# Altium footprint library SWLIB(150721).PcbLib: 348 footprints (part 15 of 22)
Each footprint in its own frame and in the unit in brackets; x right, y up, seen from the top. Pads: shape width x height; smd on the part's side, far side on the other; paste and mask are expansions set on the pad; w line width, h text height; cw(c..) or ccw(c..) is an arc to the next point about the centre after c.
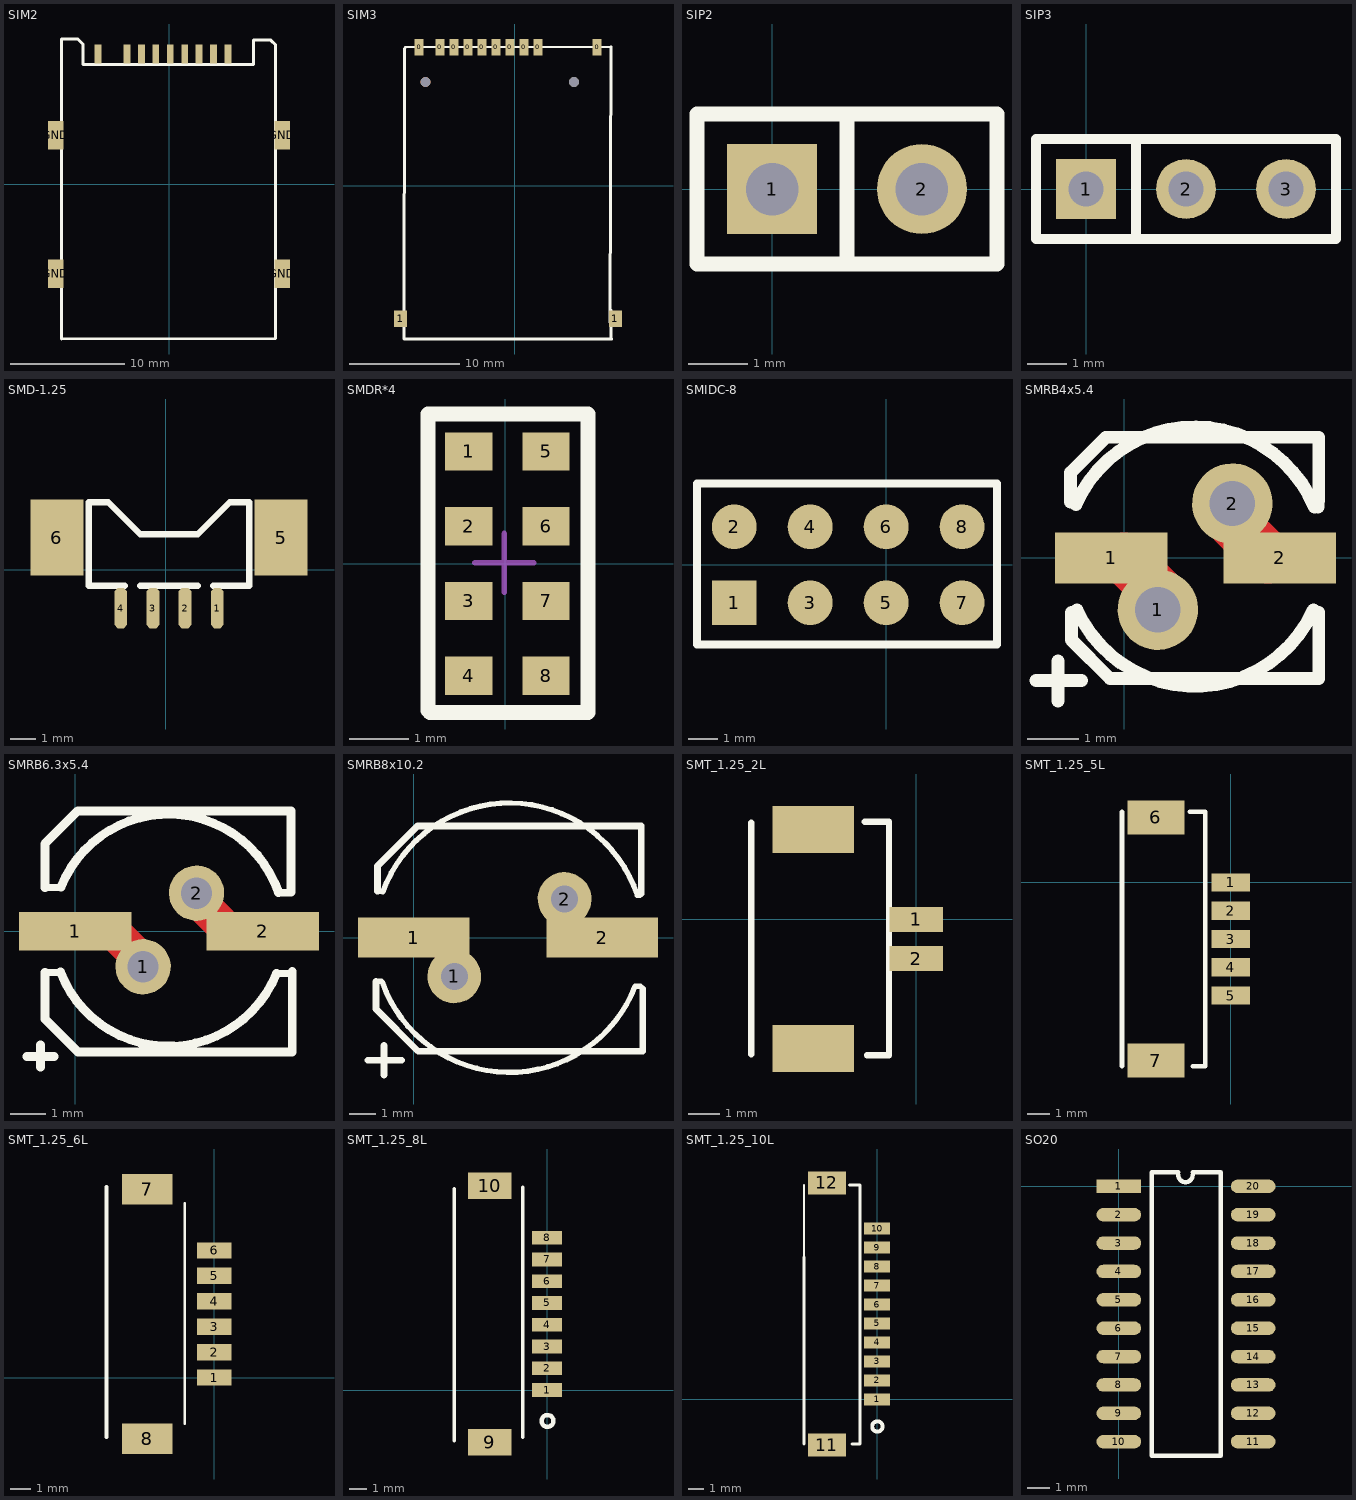
[diagram p14: the footprints below, top view; thin cyan lines are the x and y axes]

## SIM2 [mm]
pads (13):
  rect 0.6x1.65 smd: 0(-6.25,11.44) 0(-3.7,11.44) 0(-2.43,11.44) 0(-1.16,11.44) 0(0.11,11.44) 0(1.38,11.44) 0(2.65,11.44) 0(3.92,11.44) 0(5.19,11.44)
  rect 1.35x2.5 smd: GND(-9.95,-7.884) GND(-9.95,4.316) GND(9.95,-7.884) GND(9.95,4.315)
Top Overlay:
  lines w0.254: -9.44,-13.604 9.356,-13.553 9.356,12.253 8.949,12.66 7.425,12.66 7.425,10.526 -7.561,10.526 -7.561,12.304 -8.018,12.761 -9.186,12.761 -9.44,12.761 -9.44,-13.604

## SIM3 [mm]
pads (12):
  rect 0.8x1.5 smd: 0(-8.705,12.579) 0(-6.805,12.579) 0(-5.535,12.579) 0(-4.265,12.579) 0(-2.995,12.579) 0(-1.725,12.579) 0(-0.455,12.579) 0(0.815,12.579) 0(2.085,12.579) 0(7.445,12.579)
  rect 1.2x1.5 smd: 1(-10.385,-12.071) 1(9.115,-12.071)
via -8.135,9.429 diameter 0.9 hole 0.9
via 5.365,9.429 diameter 0.9 hole 0.9
Top Overlay:
  lines w0.254: 7.143,12.579 8.718,12.629 ; 8.616,-12.364 8.718,12.629 ; 8.718,-11.247 8.718,-13.837 8.769,-13.888 8.007,-13.888 -10.078,-13.888 -10.027,12.477 -9.926,12.579 8.718,12.629

## SIP2 [mil]
pads (2):
  rect 60x60 hole 35: 1(0,0)
  round 60 hole 35: 2(100,0)
Top Overlay:
  lines w10: 50,-50 50,50 ; -50,-50 -50,50 150,50 150,-50 -50,-50

## SIP3 [mil]
pads (3):
  rect 60x60 hole 35: 1(0,0)
  round 60 hole 35: 2(100,0) 3(200,0)
Top Overlay:
  lines w10: 50,-50 50,50 ; -50,-50 250,-50 250,50 -50,50 -50,-50

## SMD-1.25 [mm]
height 5.7
pads (6):
  oct 0.5x1.6 smd: 1(2.032,-1.524) 2(0.762,-1.524) 3(-0.508,-1.524) 4(-1.778,-1.524)
  rect 2.1x3 smd: 5(4.572,1.27) 6(-4.318,1.27)
Top Overlay:
  lines w0.254: -1.626,-0.635 -3.048,-0.635 -3.048,2.667 -2.993,2.667 -2.521,2.667 -2.286,2.667 -1.016,1.397 1.27,1.397 2.54,2.667 3.302,2.667 3.302,-0.635 1.879,-0.635 ; -1.016,-0.635 1.27,-0.635
3D body "SW3dPS-molex 53398-0390.STEP": height 4.76, standoff -0.04, extent -4.958,-1.588 5.192,2.612

## SMDR*4 [mm] "SOIC, 8-Leads, Body 3.2x3.2mm (max), Pitch 1.27mm, IPC Medium Density"
height 1
pads (8):
  rect 0.8x0.65 smd: 1(-0.616,1.905) 2(-0.616,0.635) 3(-0.616,-0.635) 4(-0.616,-1.905) 5(0.699,1.905) 6(0.699,0.635) 7(0.699,-0.635) 8(0.699,-1.905)
Top Overlay:
  lines w0.254: -1.306,2.53 -1.306,-2.497 -1.273,-2.53 1.407,-2.53 1.407,2.54 -1.306,2.54
Mechanical 15:
  lines w0.1: -0.513,0.013 0.487,0.013 ; -0.013,-0.487 -0.013,0.513 ; -1.262,-2.555 -1.262,2.53 1.351,2.53 1.351,-2.555 -1.262,-2.555

## SMIDC-8 [mm]
pads (8):
  rect 1.499x1.499 smd: 1(-5.08,-1.27)
  round 1.5 smd: 2(-5.08,1.27) 3(-2.54,-1.27) 4(-2.54,1.27) 5(0,-1.27) 6(0,1.27) 7(2.54,-1.27) 8(2.54,1.27)
Top Overlay:
  lines w0.254: -6.325,-2.667 -6.325,2.718 3.708,2.718 3.708,-2.667 -6.325,-2.667

## SMRB4x5.4 [mil]
pads (4):
  rect 86.61x39.37 smd: 1(-10,0) 2(120,0)
  round 62 hole 35: 1(26,-40) 2(83.36,41.92)
Top Layer:
  lines w39.37: 0,0 26,-26 26,-40 ; 83.36,41.92 83.36,27.64 111,0
Top Overlay:
  lines w10: -68,-94.5 -33,-94.5 ; -51,-110.5 -51,-79.5 ; -41.36,43 -41.36,65.64 -14,93 150,93 150,44.32 149.61,43.93 149.61,39.3 ; -40.61,-42 -40.61,-63.39 -40,-64 -11,-93 150,-93 150,-42 ; -37.26,41.2 cw(c54.32,1.04) 146.72,39.3 ; -36.49,-40.14 ccw(c54.68,0.96) 145.85,-40.13
3D body "SL-B.STEP": height 204.72, standoff 0, extent -36.55,-83.72 144.55,85.57

## SMRB6.3x5.4 [mil]
pads (4):
  rect 125.98x43.31 smd: 1(0,0) 2(210,0)
  round 62 hole 35: 1(76.02,-39.7) 2(135.83,42.72)
Top Layer:
  lines w39.37: 45,-3 76.02,-34.02 76.02,-39.7 ; 135.83,42.72 135.83,36.17 162,10
Top Overlay:
  lines w7.87: -34,-46 -17.15,-46 -16.62,-45.47 ; -34,49 -16.58,49 -15.98,49.59 ; 225.35,-47.14 240.86,-47.14 243,-45 ; 227.73,43.23 240.82,43.23 241.59,44
  lines w10: -54,-140 -24,-140 ; -39,-152 -39,-127 ; -34,-46 -34,-98 3,-135 243,-135 243,-45 ; -34,49 -34,98 2.84,134.84 241.59,134.84 241.59,44 ; -16.62,-45.47 ccw(c104.7,1.25) 225.35,-47.14 ; -15.98,49.59 cw(c104.7,1.25) 227.73,43.23
3D body "SL-E.STEP": height 204.72, standoff 0, extent -34.23,-131.32 241.36,128.52

## SMRB8x10.2 [mil]
pads (4):
  rect 165.35x59.06 smd: 1(0,0) 2(280,0)
  round 80 hole 40: 1(60.27,-57.49) 2(224.1,57.22)
Top Layer:
  lines w39.37: 29,0 60.27,-31.27 60.27,-57.49 ; 224.1,57.22 224.1,7.9 235,-3
Top Overlay:
  lines w5: -56,-65 -54.8,-66.2 -46.58,-66.2 ; -53.78,69 -47.02,69 -45.89,67.87 ; 328.7,-72.34 336.34,-72.34 340,-76 ; 331.94,63.08 335.78,63.08
  lines w7.87: -56,-65 -48,-65 ; -53.78,69 -47.02,69 -45.89,67.87 ; 328.7,-72.34 336.34,-72.34 340,-76 ; 331.94,63.08 335.78,63.08 337.7,65
  lines w8: -46.58,-66.2 ccw(c142.19,-0.14) 328.7,-72.34 ; -45.89,67.87 cw(c142.19,-0.14) 331.93,63.08
  lines w10: -68,-182 -18,-182 ; -56,-65 -56,-106 6.65,-168.65 340,-168.65 340,-76 ; -53.78,69 -53.78,106.22 5.65,165.65 337.7,165.65 337.7,65 ; -44,-204 -44,-160
3D body "SL-H.STEP": height 413.39, standoff 0, extent -31.79,-167.91 322.54,158.86

## SMT_1.25_2L [mm]
pads (4):
  rect 1.7x0.8 smd: 1(0,0) 2(0,-1.25)
  rect 2.6x1.5 smd: ""(-3.3,-4.125) ""(-3.3,2.875)
Top Overlay:
  lines w0.203: -5.283,-4.318 -5.283,3.1 ; -1.651,3.125 -0.875,3.125 -0.875,-4.343 -1.575,-4.343

## SMT_1.25_5L [mm]
pads (7):
  rect 1.7x0.8 smd: 1(0,0) 2(0,-1.25) 3(0,-2.5) 4(0,-3.75) 5(0,-5)
  rect 2.5x1.5 smd: 6(-3.3,2.875) 7(-3.3,-7.875)
Top Overlay:
  lines w0.203: -4.8,-8.125 -4.8,3.125 ; -1.803,3.125 -1.118,3.125 -1.118,-8.113 ; -1.676,-8.125 -1.143,-8.125 -1.143,-8.125

## SMT_1.25_6L [mm]
pads (8):
  rect 1.7x0.8 smd: 1(0,0) 2(0,1.25) 3(0,2.5) 4(0,3.75) 5(0,5) 6(0,6.25)
  rect 2.5x1.5 smd: 7(-3.3,9.25) 8(-3.3,-3)
Top Overlay:
  lines w0.127: -1.448,-2.261 -1.448,8.56
  lines w0.203: -5.309,-2.922 -5.309,9.373

## SMT_1.25_8L [mm]
pads (10):
  rect 1.7x0.8 smd: 1(0,0) 2(0,1.25) 3(0,2.5) 4(0,3.75) 5(0,5) 6(0,6.25) 7(0,7.5) 8(0,8.75)
  rect 2.5x1.5 smd: 9(-3.3,-3) 10(-3.277,11.735)
Top Overlay:
  circle w0.254: c0.025,-1.778 r0.341
  lines w0.203: -5.334,-2.919 -5.334,11.557 ; -1.397,-2.718 -1.397,11.659

## SMT_1.25_10L [mm]
pads (12):
  rect 1.7x0.8 smd: 1(0,0) 2(0,1.25) 3(0,2.5) 4(0,3.75) 5(0,5) 6(0,6.25) 7(0,7.5) 8(0,8.75) 9(0,10) 10(0,11.25)
  rect 2.5x1.5 smd: 11(-3.3,-3) 12(-3.3,14.25)
Top Overlay:
  circle w0.254: c0.025,-1.778 r0.341
  lines w0.127: -1.118,-2.942 -1.118,-2.942
  lines w0.152: -4.801,9.375 -4.801,14.095
  lines w0.203: -4.801,-2.919 -4.801,9.375 ; -1.803,14.12 -1.118,14.12 -1.118,-1.863 -1.118,-2.942 -1.651,-2.942

## SO20 [mm]
pads (20):
  rect 2x0.6 smd: 1(0,0)
  oval 2x0.6 smd: 2(0,-1.27) 3(0,-2.54) 4(0,-3.81) 5(0,-5.08) 6(0,-6.35) 7(0,-7.62) 8(0,-8.89) 9(0,-10.16) 10(0,-11.43) 11(6.016,-11.43) 12(6.016,-10.16) 13(6.016,-8.89) 14(6.016,-7.62) 15(6.016,-6.35) 16(6.016,-5.08) 17(6.016,-3.81) 18(6.016,-2.54) 19(6.016,-1.27) 20(6.016,0)
Top Overlay:
  lines w0.2: 2.667,0.508 ccw(c2.984,0.501) 3.302,0.508 ; 2.667,0.635 1.47,0.635 1.47,-12.065 4.572,-12.065 4.572,0.635 3.302,0.635